# Altium footprint library Mi librería.PcbLib: 434 footprints (part 19 of 28)
Each footprint in its own frame and in the unit in brackets; x right, y up, seen from the top. Pads: shape width x height; smd on the part's side, far side on the other; paste and mask are expansions set on the pad; w line width, h text height; cw(c..) or ccw(c..) is an arc to the next point about the centre after c.
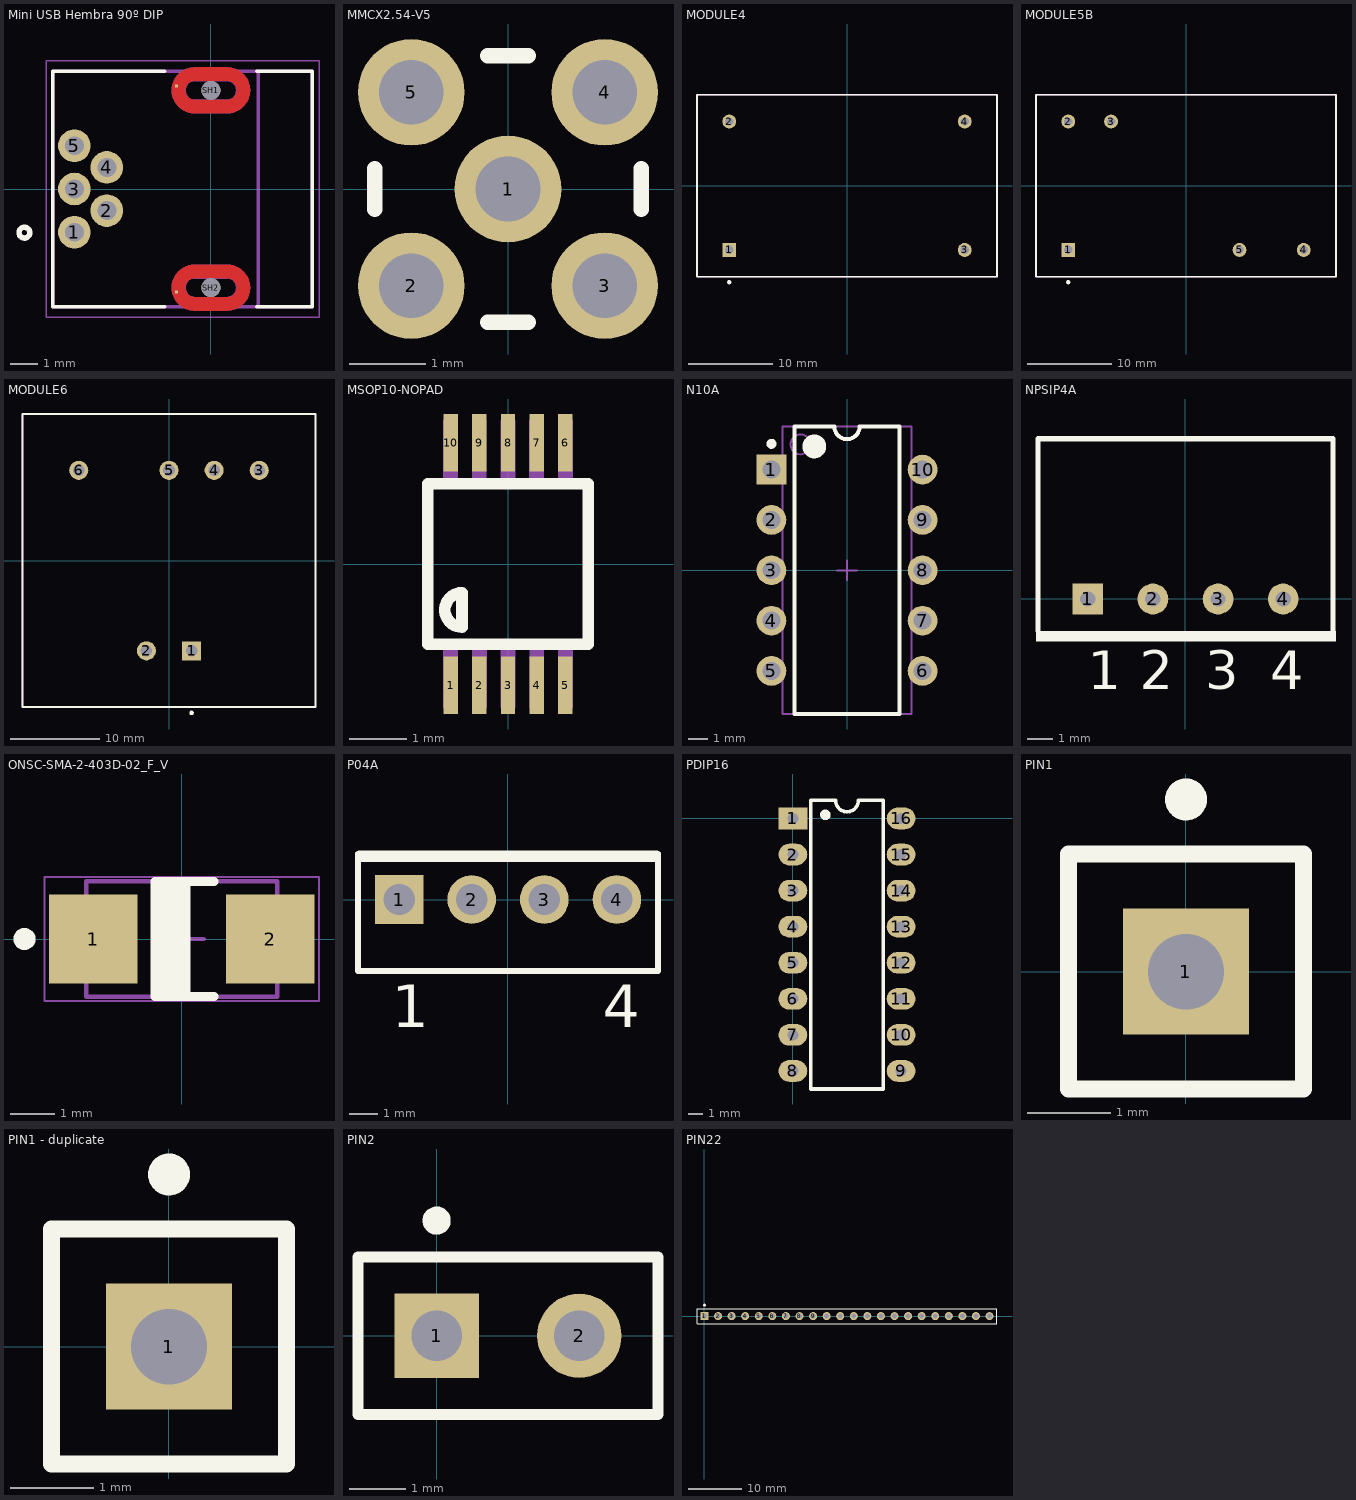
[diagram p18: the footprints below, top view; thin cyan lines are the x and y axes]

## Mini USB Hembra 90º DIP [mm] "TE_2172034-1"
pads (9):
  round 1.208 hole 0.7: 1(-5.05,-1.6) 2(-3.85,-0.8) 3(-5.05,0) 4(-3.85,0.8) 5(-5.05,1.6)
  rect 0.1x0.1 smd paste-1 mask+0: SH1(-1.27,3.81) SH2(-1.27,-3.81)
  round 0.7 hole 0.7 unplated: SH1(0,3.65) SH2(0,-3.65)
Top Layer:
  region: 0.644,-2.801 0.689,-2.805 0.733,-2.81 0.777,-2.819 0.82,-2.829 0.863,-2.842 0.905,-2.856 0.946,-2.873 0.986,-2.893 1.025,-2.914 1.063,-2.937 1.1,-2.962 1.135,-2.989 1.169,-3.018 1.201,-3.049 1.232,-3.081 1.261,-3.115 1.288,-3.15 1.313,-3.187 1.336,-3.225 1.357,-3.264 1.377,-3.304 1.394,-3.345 1.408,-3.387 1.421,-3.43 1.431,-3.473 1.44,-3.517 1.445,-3.561 1.449,-3.606 1.45,-3.65 0.95,-3.65 0.95,-3.632 0.948,-3.613 0.946,-3.595 0.942,-3.577 0.938,-3.559 0.933,-3.542 0.927,-3.525 0.92,-3.508 0.912,-3.491 0.903,-3.475 0.894,-3.459 0.883,-3.444 0.872,-3.43 0.86,-3.416 0.847,-3.403 0.834,-3.39 0.82,-3.378 0.806,-3.367 0.791,-3.356 0.775,-3.347 0.759,-3.338 0.742,-3.33 0.725,-3.323 0.708,-3.317 0.691,-3.312 0.673,-3.308 0.655,-3.304 0.637,-3.302 0.618,-3.3 0.6,-3.3 0,-3.3 0,-2.8 0.6,-2.8
  region: 1.449,-3.694 1.445,-3.739 1.44,-3.783 1.431,-3.827 1.421,-3.87 1.408,-3.913 1.394,-3.955 1.377,-3.996 1.357,-4.036 1.336,-4.075 1.313,-4.113 1.288,-4.15 1.261,-4.185 1.232,-4.219 1.201,-4.251 1.169,-4.282 1.135,-4.311 1.1,-4.338 1.063,-4.363 1.025,-4.386 0.986,-4.407 0.946,-4.427 0.905,-4.444 0.863,-4.458 0.82,-4.471 0.777,-4.481 0.733,-4.49 0.689,-4.495 0.644,-4.499 0.6,-4.5 0,-4.5 0,-4 0.6,-4 0.618,-4 0.637,-3.998 0.655,-3.996 0.673,-3.992 0.691,-3.988 0.708,-3.983 0.725,-3.977 0.742,-3.97 0.759,-3.962 0.775,-3.953 0.791,-3.944 0.806,-3.933 0.82,-3.922 0.834,-3.91 0.847,-3.897 0.86,-3.884 0.872,-3.87 0.883,-3.856 0.894,-3.841 0.903,-3.825 0.912,-3.809 0.92,-3.792 0.927,-3.775 0.933,-3.758 0.938,-3.741 0.942,-3.723 0.946,-3.705 0.948,-3.687 0.95,-3.668 0.95,-3.65 1.45,-3.65
  region: -0.95,-3.668 -0.948,-3.687 -0.946,-3.705 -0.942,-3.723 -0.938,-3.741 -0.933,-3.758 -0.927,-3.775 -0.92,-3.792 -0.912,-3.809 -0.903,-3.825 -0.894,-3.841 -0.883,-3.856 -0.872,-3.87 -0.86,-3.884 -0.847,-3.897 -0.834,-3.91 -0.82,-3.922 -0.806,-3.933 -0.791,-3.944 -0.775,-3.953 -0.759,-3.962 -0.742,-3.97 -0.725,-3.977 -0.708,-3.983 -0.691,-3.988 -0.673,-3.992 -0.655,-3.996 -0.637,-3.998 -0.618,-4 -0.6,-4 0,-4 0,-4.5 -0.6,-4.5 -0.644,-4.499 -0.689,-4.495 -0.733,-4.49 -0.777,-4.481 -0.82,-4.471 -0.863,-4.458 -0.905,-4.444 -0.946,-4.427 -0.986,-4.407 -1.025,-4.386 -1.063,-4.363 -1.1,-4.338 -1.135,-4.311 -1.169,-4.282 -1.201,-4.251 -1.232,-4.219 -1.261,-4.185 -1.288,-4.15 -1.313,-4.113 -1.336,-4.075 -1.357,-4.036 -1.377,-3.996 -1.394,-3.955 -1.408,-3.913 -1.421,-3.87 -1.431,-3.827 -1.44,-3.783 -1.445,-3.739 -1.449,-3.694 -1.45,-3.65 -0.95,-3.65
  region: 0,-3.3 -0.6,-3.3 -0.618,-3.3 -0.637,-3.302 -0.655,-3.304 -0.673,-3.308 -0.691,-3.312 -0.708,-3.317 -0.725,-3.323 -0.742,-3.33 -0.759,-3.338 -0.775,-3.347 -0.791,-3.356 -0.806,-3.367 -0.82,-3.378 -0.834,-3.39 -0.847,-3.403 -0.86,-3.416 -0.872,-3.43 -0.883,-3.444 -0.894,-3.459 -0.903,-3.475 -0.912,-3.491 -0.92,-3.508 -0.927,-3.525 -0.933,-3.542 -0.938,-3.559 -0.942,-3.577 -0.946,-3.595 -0.948,-3.613 -0.95,-3.632 -0.95,-3.65 -1.45,-3.65 -1.449,-3.606 -1.445,-3.561 -1.44,-3.517 -1.431,-3.473 -1.421,-3.43 -1.408,-3.387 -1.394,-3.345 -1.377,-3.304 -1.357,-3.264 -1.336,-3.225 -1.313,-3.187 -1.288,-3.15 -1.261,-3.115 -1.232,-3.081 -1.201,-3.049 -1.169,-3.018 -1.135,-2.989 -1.1,-2.962 -1.063,-2.937 -1.025,-2.914 -0.986,-2.893 -0.946,-2.873 -0.905,-2.856 -0.863,-2.842 -0.82,-2.829 -0.777,-2.819 -0.733,-2.81 -0.689,-2.805 -0.644,-2.801 -0.6,-2.8 0,-2.8
  region: 0.644,4.499 0.689,4.495 0.733,4.49 0.777,4.481 0.82,4.471 0.863,4.458 0.905,4.444 0.946,4.427 0.986,4.407 1.025,4.386 1.063,4.363 1.1,4.338 1.135,4.311 1.169,4.282 1.201,4.251 1.232,4.219 1.261,4.185 1.288,4.15 1.313,4.113 1.336,4.075 1.357,4.036 1.377,3.996 1.394,3.955 1.408,3.913 1.421,3.87 1.431,3.827 1.44,3.783 1.445,3.739 1.449,3.694 1.45,3.65 0.95,3.65 0.95,3.668 0.948,3.687 0.946,3.705 0.942,3.723 0.938,3.741 0.933,3.758 0.927,3.775 0.92,3.792 0.912,3.809 0.903,3.825 0.894,3.841 0.883,3.856 0.872,3.87 0.86,3.884 0.847,3.897 0.834,3.91 0.82,3.922 0.806,3.933 0.791,3.944 0.775,3.953 0.759,3.962 0.742,3.97 0.725,3.977 0.708,3.983 0.691,3.988 0.673,3.992 0.655,3.996 0.637,3.998 0.618,4 0.6,4 0,4 0,4.5 0.6,4.5
  region: 1.449,3.606 1.445,3.561 1.44,3.517 1.431,3.473 1.421,3.43 1.408,3.387 1.394,3.345 1.377,3.304 1.357,3.264 1.336,3.225 1.313,3.187 1.288,3.15 1.261,3.115 1.232,3.081 1.201,3.049 1.169,3.018 1.135,2.989 1.1,2.962 1.063,2.937 1.025,2.914 0.986,2.893 0.946,2.873 0.905,2.856 0.863,2.842 0.82,2.829 0.777,2.819 0.733,2.81 0.689,2.805 0.644,2.801 0.6,2.8 0,2.8 0,3.3 0.6,3.3 0.618,3.3 0.637,3.302 0.655,3.304 0.673,3.308 0.691,3.312 0.708,3.317 0.725,3.323 0.742,3.33 0.759,3.338 0.775,3.347 0.791,3.356 0.806,3.367 0.82,3.378 0.834,3.39 0.847,3.403 0.86,3.416 0.872,3.43 0.883,3.444 0.894,3.459 0.903,3.475 0.912,3.491 0.92,3.508 0.927,3.525 0.933,3.542 0.938,3.559 0.942,3.577 0.946,3.595 0.948,3.613 0.95,3.632 0.95,3.65 1.45,3.65
  region: -0.95,3.632 -0.948,3.613 -0.946,3.595 -0.942,3.577 -0.938,3.559 -0.933,3.542 -0.927,3.525 -0.92,3.508 -0.912,3.491 -0.903,3.475 -0.894,3.459 -0.883,3.444 -0.872,3.43 -0.86,3.416 -0.847,3.403 -0.834,3.39 -0.82,3.378 -0.806,3.367 -0.791,3.356 -0.775,3.347 -0.759,3.338 -0.742,3.33 -0.725,3.323 -0.708,3.317 -0.691,3.312 -0.673,3.308 -0.655,3.304 -0.637,3.302 -0.618,3.3 -0.6,3.3 0,3.3 0,2.8 -0.6,2.8 -0.644,2.801 -0.689,2.805 -0.733,2.81 -0.777,2.819 -0.82,2.829 -0.863,2.842 -0.905,2.856 -0.946,2.873 -0.986,2.893 -1.025,2.914 -1.063,2.937 -1.1,2.962 -1.135,2.989 -1.169,3.018 -1.201,3.049 -1.232,3.081 -1.261,3.115 -1.288,3.15 -1.313,3.187 -1.336,3.225 -1.357,3.264 -1.377,3.304 -1.394,3.345 -1.408,3.387 -1.421,3.43 -1.431,3.473 -1.44,3.517 -1.445,3.561 -1.449,3.606 -1.45,3.65 -0.95,3.65
  region: 0,4 -0.6,4 -0.618,4 -0.637,3.998 -0.655,3.996 -0.673,3.992 -0.691,3.988 -0.708,3.983 -0.725,3.977 -0.742,3.97 -0.759,3.962 -0.775,3.953 -0.791,3.944 -0.806,3.933 -0.82,3.922 -0.834,3.91 -0.847,3.897 -0.86,3.884 -0.872,3.87 -0.883,3.856 -0.894,3.841 -0.903,3.825 -0.912,3.809 -0.92,3.792 -0.927,3.775 -0.933,3.758 -0.938,3.741 -0.942,3.723 -0.946,3.705 -0.948,3.687 -0.95,3.668 -0.95,3.65 -1.45,3.65 -1.449,3.694 -1.445,3.739 -1.44,3.783 -1.431,3.827 -1.421,3.87 -1.408,3.913 -1.394,3.955 -1.377,3.996 -1.357,4.036 -1.336,4.075 -1.313,4.113 -1.288,4.15 -1.261,4.185 -1.232,4.219 -1.201,4.251 -1.169,4.282 -1.135,4.311 -1.1,4.338 -1.063,4.363 -1.025,4.386 -0.986,4.407 -0.946,4.427 -0.905,4.444 -0.863,4.458 -0.82,4.471 -0.777,4.481 -0.733,4.49 -0.689,4.495 -0.644,4.499 -0.6,4.5 0,4.5
Bottom Layer:
  region: 0,-3.3 -0.6,-3.3 -0.618,-3.3 -0.637,-3.302 -0.655,-3.304 -0.673,-3.308 -0.691,-3.312 -0.708,-3.317 -0.725,-3.323 -0.742,-3.33 -0.759,-3.338 -0.775,-3.347 -0.791,-3.356 -0.806,-3.367 -0.82,-3.378 -0.834,-3.39 -0.847,-3.403 -0.86,-3.416 -0.872,-3.43 -0.883,-3.444 -0.894,-3.459 -0.903,-3.475 -0.912,-3.491 -0.92,-3.508 -0.927,-3.525 -0.933,-3.542 -0.938,-3.559 -0.942,-3.577 -0.946,-3.595 -0.948,-3.613 -0.95,-3.632 -0.95,-3.65 -1.45,-3.65 -1.449,-3.606 -1.445,-3.561 -1.44,-3.517 -1.431,-3.473 -1.421,-3.43 -1.408,-3.387 -1.394,-3.345 -1.377,-3.304 -1.357,-3.264 -1.336,-3.225 -1.313,-3.187 -1.288,-3.15 -1.261,-3.115 -1.232,-3.081 -1.201,-3.049 -1.169,-3.018 -1.135,-2.989 -1.1,-2.962 -1.063,-2.937 -1.025,-2.914 -0.986,-2.893 -0.946,-2.873 -0.905,-2.856 -0.863,-2.842 -0.82,-2.829 -0.777,-2.819 -0.733,-2.81 -0.689,-2.805 -0.644,-2.801 -0.6,-2.8 0,-2.8
  region: -0.95,-3.668 -0.948,-3.687 -0.946,-3.705 -0.942,-3.723 -0.938,-3.741 -0.933,-3.758 -0.927,-3.775 -0.92,-3.792 -0.912,-3.809 -0.903,-3.825 -0.894,-3.841 -0.883,-3.856 -0.872,-3.87 -0.86,-3.884 -0.847,-3.897 -0.834,-3.91 -0.82,-3.922 -0.806,-3.933 -0.791,-3.944 -0.775,-3.953 -0.759,-3.962 -0.742,-3.97 -0.725,-3.977 -0.708,-3.983 -0.691,-3.988 -0.673,-3.992 -0.655,-3.996 -0.637,-3.998 -0.618,-4 -0.6,-4 0,-4 0,-4.5 -0.6,-4.5 -0.644,-4.499 -0.689,-4.495 -0.733,-4.49 -0.777,-4.481 -0.82,-4.471 -0.863,-4.458 -0.905,-4.444 -0.946,-4.427 -0.986,-4.407 -1.025,-4.386 -1.063,-4.363 -1.1,-4.338 -1.135,-4.311 -1.169,-4.282 -1.201,-4.251 -1.232,-4.219 -1.261,-4.185 -1.288,-4.15 -1.313,-4.113 -1.336,-4.075 -1.357,-4.036 -1.377,-3.996 -1.394,-3.955 -1.408,-3.913 -1.421,-3.87 -1.431,-3.827 -1.44,-3.783 -1.445,-3.739 -1.449,-3.694 -1.45,-3.65 -0.95,-3.65
  region: 1.449,-3.694 1.445,-3.739 1.44,-3.783 1.431,-3.827 1.421,-3.87 1.408,-3.913 1.394,-3.955 1.377,-3.996 1.357,-4.036 1.336,-4.075 1.313,-4.113 1.288,-4.15 1.261,-4.185 1.232,-4.219 1.201,-4.251 1.169,-4.282 1.135,-4.311 1.1,-4.338 1.063,-4.363 1.025,-4.386 0.986,-4.407 0.946,-4.427 0.905,-4.444 0.863,-4.458 0.82,-4.471 0.777,-4.481 0.733,-4.49 0.689,-4.495 0.644,-4.499 0.6,-4.5 0,-4.5 0,-4 0.6,-4 0.618,-4 0.637,-3.998 0.655,-3.996 0.673,-3.992 0.691,-3.988 0.708,-3.983 0.725,-3.977 0.742,-3.97 0.759,-3.962 0.775,-3.953 0.791,-3.944 0.806,-3.933 0.82,-3.922 0.834,-3.91 0.847,-3.897 0.86,-3.884 0.872,-3.87 0.883,-3.856 0.894,-3.841 0.903,-3.825 0.912,-3.809 0.92,-3.792 0.927,-3.775 0.933,-3.758 0.938,-3.741 0.942,-3.723 0.946,-3.705 0.948,-3.687 0.95,-3.668 0.95,-3.65 1.45,-3.65
  region: 0.644,-2.801 0.689,-2.805 0.733,-2.81 0.777,-2.819 0.82,-2.829 0.863,-2.842 0.905,-2.856 0.946,-2.873 0.986,-2.893 1.025,-2.914 1.063,-2.937 1.1,-2.962 1.135,-2.989 1.169,-3.018 1.201,-3.049 1.232,-3.081 1.261,-3.115 1.288,-3.15 1.313,-3.187 1.336,-3.225 1.357,-3.264 1.377,-3.304 1.394,-3.345 1.408,-3.387 1.421,-3.43 1.431,-3.473 1.44,-3.517 1.445,-3.561 1.449,-3.606 1.45,-3.65 0.95,-3.65 0.95,-3.632 0.948,-3.613 0.946,-3.595 0.942,-3.577 0.938,-3.559 0.933,-3.542 0.927,-3.525 0.92,-3.508 0.912,-3.491 0.903,-3.475 0.894,-3.459 0.883,-3.444 0.872,-3.43 0.86,-3.416 0.847,-3.403 0.834,-3.39 0.82,-3.378 0.806,-3.367 0.791,-3.356 0.775,-3.347 0.759,-3.338 0.742,-3.33 0.725,-3.323 0.708,-3.317 0.691,-3.312 0.673,-3.308 0.655,-3.304 0.637,-3.302 0.618,-3.3 0.6,-3.3 0,-3.3 0,-2.8 0.6,-2.8
  region: 0,4 -0.6,4 -0.618,4 -0.637,3.998 -0.655,3.996 -0.673,3.992 -0.691,3.988 -0.708,3.983 -0.725,3.977 -0.742,3.97 -0.759,3.962 -0.775,3.953 -0.791,3.944 -0.806,3.933 -0.82,3.922 -0.834,3.91 -0.847,3.897 -0.86,3.884 -0.872,3.87 -0.883,3.856 -0.894,3.841 -0.903,3.825 -0.912,3.809 -0.92,3.792 -0.927,3.775 -0.933,3.758 -0.938,3.741 -0.942,3.723 -0.946,3.705 -0.948,3.687 -0.95,3.668 -0.95,3.65 -1.45,3.65 -1.449,3.694 -1.445,3.739 -1.44,3.783 -1.431,3.827 -1.421,3.87 -1.408,3.913 -1.394,3.955 -1.377,3.996 -1.357,4.036 -1.336,4.075 -1.313,4.113 -1.288,4.15 -1.261,4.185 -1.232,4.219 -1.201,4.251 -1.169,4.282 -1.135,4.311 -1.1,4.338 -1.063,4.363 -1.025,4.386 -0.986,4.407 -0.946,4.427 -0.905,4.444 -0.863,4.458 -0.82,4.471 -0.777,4.481 -0.733,4.49 -0.689,4.495 -0.644,4.499 -0.6,4.5 0,4.5
  region: -0.95,3.632 -0.948,3.613 -0.946,3.595 -0.942,3.577 -0.938,3.559 -0.933,3.542 -0.927,3.525 -0.92,3.508 -0.912,3.491 -0.903,3.475 -0.894,3.459 -0.883,3.444 -0.872,3.43 -0.86,3.416 -0.847,3.403 -0.834,3.39 -0.82,3.378 -0.806,3.367 -0.791,3.356 -0.775,3.347 -0.759,3.338 -0.742,3.33 -0.725,3.323 -0.708,3.317 -0.691,3.312 -0.673,3.308 -0.655,3.304 -0.637,3.302 -0.618,3.3 -0.6,3.3 0,3.3 0,2.8 -0.6,2.8 -0.644,2.801 -0.689,2.805 -0.733,2.81 -0.777,2.819 -0.82,2.829 -0.863,2.842 -0.905,2.856 -0.946,2.873 -0.986,2.893 -1.025,2.914 -1.063,2.937 -1.1,2.962 -1.135,2.989 -1.169,3.018 -1.201,3.049 -1.232,3.081 -1.261,3.115 -1.288,3.15 -1.313,3.187 -1.336,3.225 -1.357,3.264 -1.377,3.304 -1.394,3.345 -1.408,3.387 -1.421,3.43 -1.431,3.473 -1.44,3.517 -1.445,3.561 -1.449,3.606 -1.45,3.65 -0.95,3.65
  region: 1.449,3.606 1.445,3.561 1.44,3.517 1.431,3.473 1.421,3.43 1.408,3.387 1.394,3.345 1.377,3.304 1.357,3.264 1.336,3.225 1.313,3.187 1.288,3.15 1.261,3.115 1.232,3.081 1.201,3.049 1.169,3.018 1.135,2.989 1.1,2.962 1.063,2.937 1.025,2.914 0.986,2.893 0.946,2.873 0.905,2.856 0.863,2.842 0.82,2.829 0.777,2.819 0.733,2.81 0.689,2.805 0.644,2.801 0.6,2.8 0,2.8 0,3.3 0.6,3.3 0.618,3.3 0.637,3.302 0.655,3.304 0.673,3.308 0.691,3.312 0.708,3.317 0.725,3.323 0.742,3.33 0.759,3.338 0.775,3.347 0.791,3.356 0.806,3.367 0.82,3.378 0.834,3.39 0.847,3.403 0.86,3.416 0.872,3.43 0.883,3.444 0.894,3.459 0.903,3.475 0.912,3.491 0.92,3.508 0.927,3.525 0.933,3.542 0.938,3.559 0.942,3.577 0.946,3.595 0.948,3.613 0.95,3.632 0.95,3.65 1.45,3.65
  region: 0.644,4.499 0.689,4.495 0.733,4.49 0.777,4.481 0.82,4.471 0.863,4.458 0.905,4.444 0.946,4.427 0.986,4.407 1.025,4.386 1.063,4.363 1.1,4.338 1.135,4.311 1.169,4.282 1.201,4.251 1.232,4.219 1.261,4.185 1.288,4.15 1.313,4.113 1.336,4.075 1.357,4.036 1.377,3.996 1.394,3.955 1.408,3.913 1.421,3.87 1.431,3.827 1.44,3.783 1.445,3.739 1.449,3.694 1.45,3.65 0.95,3.65 0.95,3.668 0.948,3.687 0.946,3.705 0.942,3.723 0.938,3.741 0.933,3.758 0.927,3.775 0.92,3.792 0.912,3.809 0.903,3.825 0.894,3.841 0.883,3.856 0.872,3.87 0.86,3.884 0.847,3.897 0.834,3.91 0.82,3.922 0.806,3.933 0.791,3.944 0.775,3.953 0.759,3.962 0.742,3.97 0.725,3.977 0.708,3.983 0.691,3.988 0.673,3.992 0.655,3.996 0.637,3.998 0.618,4 0.6,4 0,4 0,4.5 0.6,4.5
Top Overlay:
  circle w0.2: c-6.9,-1.615 r0.2
  lines w0.127: -1.7,-4.35 -5.85,-4.35 -5.85,4.35 -1.7,4.35 ; 1.7,-4.35 3.75,-4.35 3.75,4.35 1.7,4.35
Top Paste:
  drawing of 8 lines, arcs and shapes, not listed
Bottom Paste:
  drawing of 8 lines, arcs and shapes, not listed
Top Solder:
  region: 1.55,2.704 -1.552,2.704 -1.552,4.6 1.55,4.6
  region: 1.55,-4.604 -1.551,-4.604 -1.551,-2.7 1.55,-2.7
  region: 1.55,-4.609 -1.553,-4.609 -1.553,-2.7 1.55,-2.7
Bottom Solder:
  region: 1.55,-4.607 -1.552,-4.607 -1.552,-2.7 1.55,-2.7
  region: 1.55,2.702 -1.551,2.702 -1.551,4.6 1.55,4.6
Mechanical 1:
  lines w0: -0.95,-3.65 ccw(c-0.6,-3.65) -0.6,-4 0.6,-4 ccw(c0.6,-3.65) 0.95,-3.65 ccw(c0.6,-3.65) 0.6,-3.3 -0.6,-3.3 ccw(c-0.6,-3.65) -0.95,-3.65 ; -0.95,3.65 ccw(c-0.6,3.65) -0.6,3.3 0.6,3.3 ccw(c0.6,3.65) 0.95,3.65 ccw(c0.6,3.65) 0.6,4 -0.6,4 ccw(c-0.6,3.65) -0.95,3.65
Mechanical 13:
  circle w0.2: c-5.05,-1.6 r0.2
  lines w0.127: 1.75,-4.35 1.75,4.35 ; 1.75,-4.35 3.75,-4.35 3.75,4.35 1.75,4.35 ; 1.75,-4.35 -5.85,-4.35 -5.85,4.35 1.75,4.35
  text "PCB EDGE" at 1.651,-1.271 h0.5
Mechanical 15:
  lines w0.05: -6.1,-4.75 -6.1,4.75 4,4.75 4,-4.75 -6.1,-4.75
3D body "2172034-1--3DModel-STEP-56544.STEP": height 4.17, standoff -2.77, extent -5.844,-4.326 3.756,4.375

## MMCX2.54-V5 [mm] "Connector; RF Coaxial, MMCX, Thru-Hole; 5 Position; Vertical"
height 4.45
pads (5):
  round 1.4 hole 0.85: 1(0,0) 2(-1.27,-1.27) 3(1.27,-1.27) 4(1.27,1.27) 5(-1.27,1.27)
Top Overlay:
  lines w0.2: -1.75,-0.27 -1.75,0.27 ; -0.27,-1.75 0.27,-1.75 ; -0.27,1.75 0.27,1.75 ; 1.75,-0.27 1.75,0.27

## MODULE4 [mm] "DIP; 4 Round Pins; Row Space 27.94 mm; Pitch 15.24 mm"
height 14
pads (4):
  rect 1.65x1.65 hole 1: 1(-13.97,-7.62)
  round 1.65 hole 1: 2(-13.97,7.62) 3(13.97,-7.62) 4(13.97,7.62)
Top Overlay:
  circle w0.25: c-13.97,-11.45 r0.125
  lines w0.2: -17.8,-10.8 -17.8,10.8 17.8,10.8 17.8,-10.8 -17.8,-10.8
Mechanical 13:
  lines w0.1: -17.8,-10.8 -17.8,10.8 17.8,10.8 17.8,-10.8 -17.8,-10.8
3D body: height 14, standoff 0, extent -17.8,-10.8 17.8,10.8

## MODULE5B [mm] "DIP; 5 Round Pins; Row Space 15.24 mm; Pitch 2.54 mm"
height 14
pads (5):
  rect 1.65x1.65 hole 1: 1(-13.97,-7.62)
  round 1.65 hole 1: 2(-13.97,7.62) 3(-8.89,7.62) 4(13.97,-7.62) 5(6.35,-7.62)
Top Overlay:
  circle w0.25: c-13.97,-11.45 r0.125
  lines w0.2: -17.8,-10.8 17.8,-10.8 17.8,10.8 -17.8,10.8 -17.8,-10.8
Mechanical 13:
  lines w0.1: -17.8,-10.8 -17.8,10.8 17.8,10.8 17.8,-10.8 -17.8,-10.8
3D body: height 14, standoff 0, extent -17.8,-10.8 17.8,10.8

## MODULE6 [mm] "DIP; 6 Round Pins; Row Space 20.32 mm; Pitch 2.54 mm"
height 16.5
pads (6):
  rect 2.15x2.15 hole 1.3: 1(2.54,-10.16)
  round 2.15 hole 1.3: 2(-2.54,-10.16) 3(10.16,10.16) 4(5.08,10.16) 5(0,10.16) 6(-10.16,10.16)
Top Overlay:
  circle w0.25: c2.54,-17.15 r0.125
  lines w0.2: -16.5,-16.5 -16.5,16.5 16.5,16.5 16.5,-16.5 -16.5,-16.5
Mechanical 13:
  lines w0.1: -16.5,-16.5 -16.5,16.5 16.5,16.5 16.5,-16.5 -16.5,-16.5
3D body: height 16.5, standoff 0, extent -16.5,-16.5 16.5,16.5

## MSOP10-NOPAD [mm]
pads (10):
  rect 0.25x1 smd: 1(-1,-2.113) 2(-0.5,-2.113) 3(0,-2.113) 4(0.5,-2.113) 5(1,-2.113) 6(1,2.113) 7(0.5,2.113) 8(0,2.113) 9(-0.5,2.113) 10(-1,2.113)
Top Overlay:
  lines w0.203: -1.4,-1.4 1.4,-1.4 1.4,1.4 -1.4,1.4 -1.4,-1.4 ; -0.8,-1.1 cw(c-0.8,-0.8) -0.8,-0.5 -0.8,-1.1
Mechanical 13:
  region: -0.874,-2.5 -1.124,-2.5 -1.124,-1.5 -0.874,-1.5
  region: -0.374,-2.5 -0.624,-2.5 -0.624,-1.5 -0.374,-1.5
  region: 0.126,-2.5 -0.124,-2.5 -0.124,-1.5 0.126,-1.5
  region: 0.626,-2.5 0.376,-2.5 0.376,-1.5 0.626,-1.5
  region: 1.126,-2.5 0.876,-2.5 0.876,-1.5 1.126,-1.5
  region: 1.124,1.5 0.874,1.5 0.874,2.5 1.124,2.5
  region: 0.624,1.5 0.374,1.5 0.374,2.5 0.624,2.5
  region: 0.124,1.5 -0.126,1.5 -0.126,2.5 0.124,2.5
  region: -0.376,1.5 -0.626,1.5 -0.626,2.5 -0.376,2.5
  region: -0.876,1.5 -1.126,1.5 -1.126,2.5 -0.876,2.5

## N10A [mm] "DIP; 10 Leads; Row Spacing 7.62 mm; Pitch 2.54 mm"
height 5.08
pads (10):
  rect 1.5x1.5 hole 0.9: 1(-3.81,5.08)
  round 1.5 hole 0.9: 2(-3.81,2.54) 3(-3.81,0) 4(-3.81,-2.54) 5(-3.81,-5.08) 6(3.81,-5.08) 7(3.81,-2.54) 8(3.81,0) 9(3.81,2.54) 10(3.81,5.08)
Top Overlay:
  circle w0.25: c-3.81,6.38 r0.125
  circle w0.6: c-1.65,6.25 r0.3
  lines w0.2: -2.65,-7.25 -2.65,7.25 -0.635,7.25 ccw(c0,7.25) 0.635,7.25 2.65,7.25 2.65,-7.25 -2.65,-7.25
Mechanical 13:
  circle w0.1: c-2.35,6.35 r0.5
  lines w0.1: -3.25,-7.25 -3.25,7.25 3.25,7.25 3.25,-7.25 -3.25,-7.25
Mechanical 15:
  lines w0.1: -0.5,0 0.5,0 ; 0,-0.5 0,0.5
3D body: height 5.08, standoff 0, extent -3.25,-7.25 3.25,7.25

## NPSIP4A [mm] "SIP; 4 Leads; Body 10 x 11.5 x 7.5 mm (typ); Pitch 2.54 mm"
height 10.6
pads (4):
  rect 1.2x1.2 hole 0.6: 1(-3.81,0)
  round 1.2 hole 0.6: 2(-1.27,0) 3(1.27,0) 4(3.81,0)
Top Overlay:
  rectangle: -5.83,-1.65 5.87,-1.25
  lines w0.2: -5.75,-1.25 -5.75,6.25 5.75,6.25 5.75,-1.25
  text "1" at -3.81,-3.52 h1.5
  text "2" at -1.778,-3.52 h1.5
  text "3" at 0.762,-3.52 h1.5
  text "4" at 3.302,-3.52 h1.5

## ONSC-SMA-2-403D-02_F_V [mm] "Molded, 2-Leads, Body 4.32x2.6mm"
height 2.2
pads (2):
  rect 2x2 smd: 1(-2,0) 2(2,0)
Top Overlay:
  circle w0.25: c-3.55,0 r0.125
  rectangle: -0.578,-1.3 0.199,1.3
  lines w0.2: 0.736,-1.3 -0.6,-1.3 -0.6,1.3 ; 0.736,1.3 -0.6,1.3 ; -0.6,1.3 -0.6,1.3
Mechanical 13:
  lines w0.1: -2.16,-1.3 -2.16,1.3 2.16,1.3 2.16,-1.3 -2.16,-1.3
Mechanical 15:
  lines w0.05: -3.1,-1.4 3.1,-1.4 3.1,1.4 -3.1,1.4 -3.1,-1.4
  lines w0.1: -0.5,0 0.5,0 ; 0,-0.5 0,0.5
3D body: height 2.2, standoff 0.05, extent -2.16,-1.3 2.16,1.3

## P04A [mm] "TO, Thru-Hole, Vertical, Heatsink Mounted; 4 In-Line Leads; Pitch 2.54 mm"
height 20.6
pads (4):
  rect 1.7x1.7 hole 1.1: 1(-3.81,0)
  round 1.7 hole 1.1: 2(-1.27,0) 3(1.27,0) 4(3.81,0)
Top Overlay:
  rectangle: -5.25,1.311 5.25,1.711
  lines w0.2: -5.25,1.6 -5.25,-2.5 5.25,-2.5 5.25,1.6
  text "1" at -4.06,-4.475 h1.5
  text "4" at 3.31,-4.475 h1.5

## PCBComponent_1 [mm]

## PDIP16 [mil]
height 200
pads (16):
  rect 80x60 hole 30: 1(0,0)
  oval 80x60 hole 30: 2(0,-100) 3(0,-200) 4(0,-300) 5(0,-400) 6(0,-500) 7(0,-600) 8(0,-700) 9(300,-700) 10(300,-600) 11(300,-500) 12(300,-400) 13(300,-300) 14(300,-200) 15(300,-100) 16(300,0)
Top Overlay:
  circle w15: c90,10 r7
  lines w10: 50,-750 50,50 118.38,50 ccw(c150,50) 181.62,50 250,50 250,-750 50,-750
3D body: height 200, standoff 0, extent 50,-750 250,50

## PIN1 [mm] "Generic Antenna; 1 Lead"
pads (1):
  rect 1.5x1.5 hole 0.9: 1(0,0)
Top Overlay:
  circle w0.25: c0,2.05 r0.125
  lines w0.2: -1.4,-1.4 -1.4,1.4 1.4,1.4 1.4,-1.4 -1.4,-1.4

## PIN1 - duplicate [mm] "Connector; Plug"
pads (1):
  rect 1.5x1.5 hole 0.9: 1(0,0)
Top Overlay:
  circle w0.25: c0,2.05 r0.125
  lines w0.2: -1.4,-1.4 1.4,-1.4 1.4,1.4 -1.4,1.4 -1.4,-1.4

## PIN2 [mm] "Photosensitive Diode; 2 Leads"
pads (2):
  rect 1.5x1.5 hole 0.9: 1(0,0)
  round 1.5 hole 0.9: 2(2.54,0)
Top Overlay:
  circle w0.25: c0,2.05 r0.125
  lines w0.2: -1.4,-1.4 -1.4,1.4 3.94,1.4 3.94,-1.4 -1.4,-1.4

## PIN22 [mm] "Connector; Edge; 22 Position"
pads (22):
  rect 1.5x1.5 hole 0.9: 1(0,0)
  round 1.5 hole 0.9: 2(2.54,0) 3(5.08,0) 4(7.62,0) 5(10.16,0) 6(12.7,0) 7(15.24,0) 8(17.78,0) 10(22.86,0) 11(25.4,0) 12(27.94,0) 13(30.48,0) 14(33.02,0) 15(35.56,0) 16(38.1,0) 17(40.64,0) 18(43.18,0) 19(45.72,0) 20(48.26,0) 21(50.8,0) 22(53.34,0)
  oval 1.51x1.5 hole 0.9: 9(20.32,0)
Top Overlay:
  circle w0.25: c0,2.05 r0.125
  lines w0.2: -1.4,-1.4 54.74,-1.4 54.74,1.4 -1.4,1.4 -1.4,-1.4